# Altium footprint library tinyCamera.PcbLib: 101 footprints (part 5 of 7)
Each footprint in its own frame and in the unit in brackets; x right, y up, seen from the top. Pads: shape width x height; smd on the part's side, far side on the other; paste and mask are expansions set on the pad; w line width, h text height; cw(c..) or ccw(c..) is an arc to the next point about the centre after c.
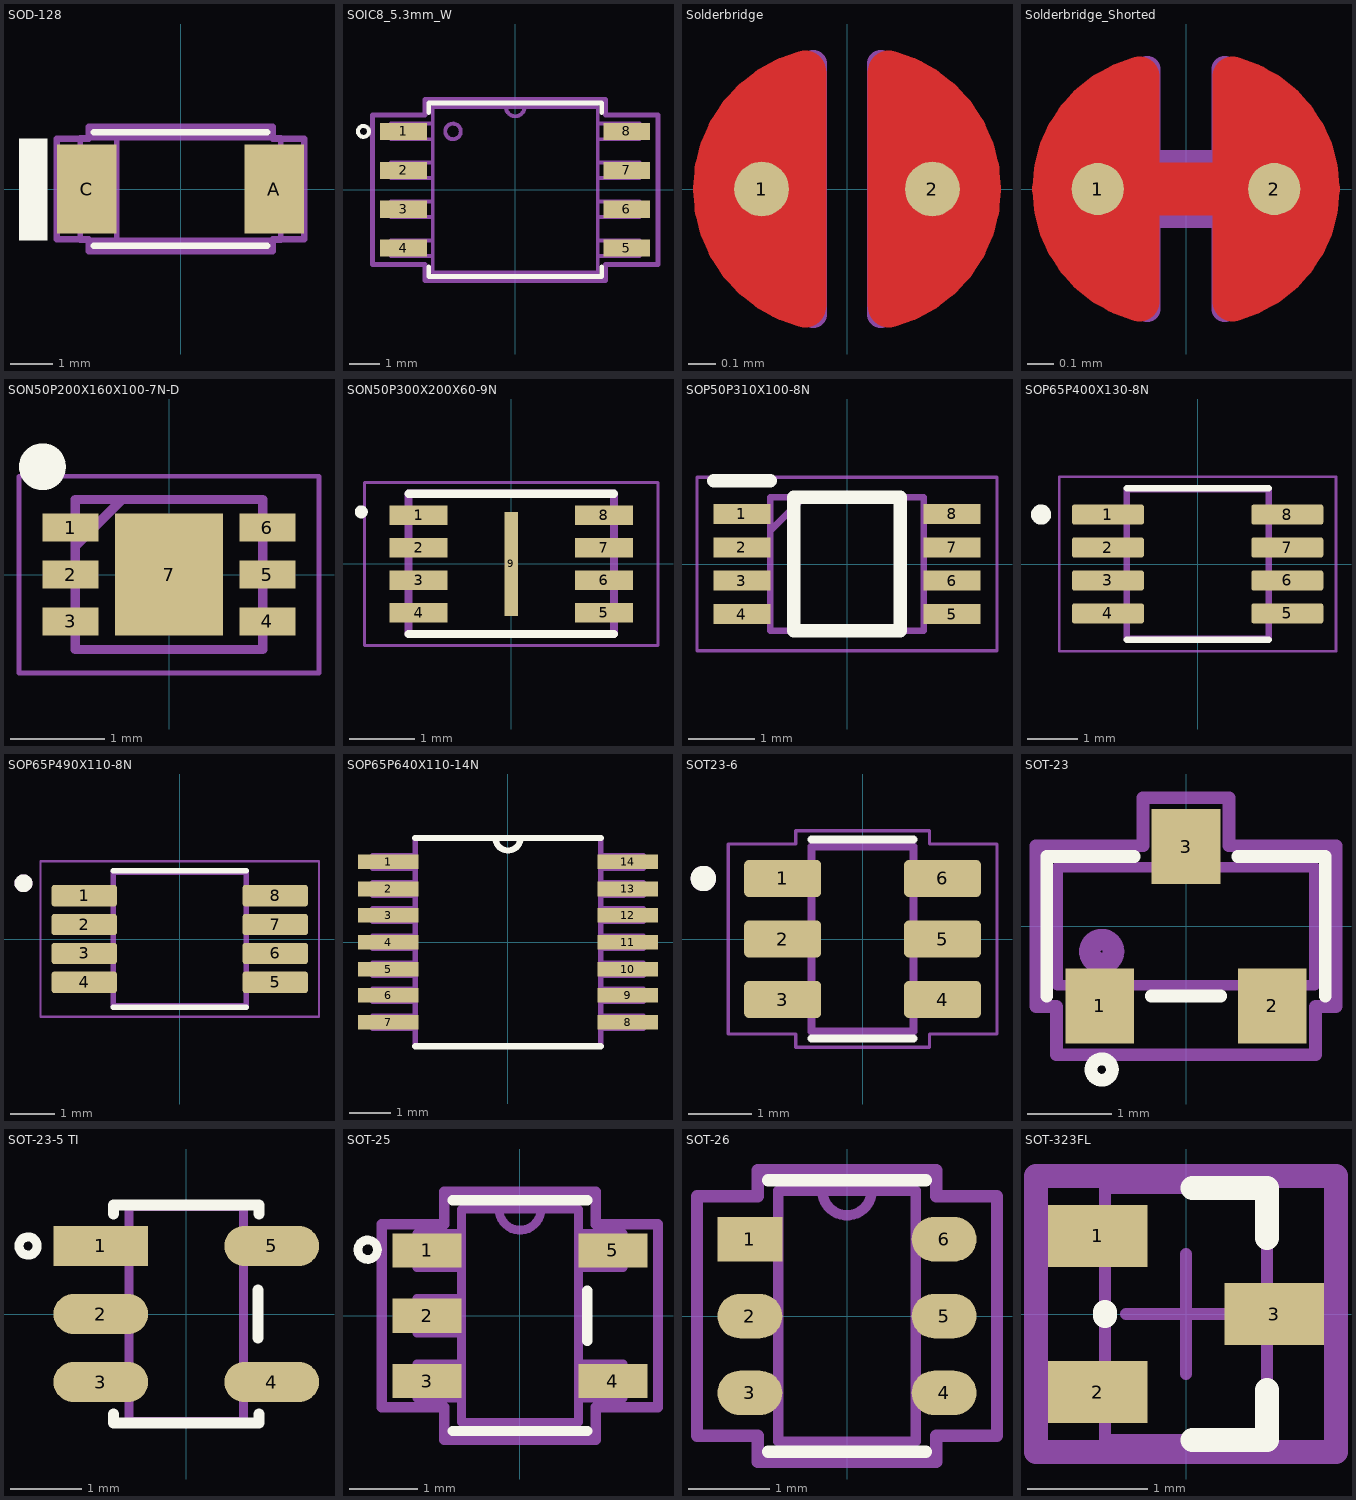
[diagram p4: the footprints below, top view; thin cyan lines are the x and y axes]

## SOD-128 [mm]
pads (2):
  rect 1.4x2.1 smd paste+0 mask+0: A(2.2,0) C(-2.2,0)
Top Overlay:
  rectangle: -3.792,-1.206 -3.124,1.181
  lines w0.152: -2.032,-1.333 2.032,-1.333 ; -2.032,1.333 2.032,1.333
Mechanical 13:
  lines w0.127: -1.5,-1.2 -1.5,1.2 ; -2.35,-1.2 2.35,-1.2 2.35,1.2 -2.35,1.2 -2.35,-1.2
  text ".Designator" at -0.433,-0.376 h1.27
Mechanical 15:
  lines w0.152: -2.908,-1.181 -2.159,-1.181 -2.159,-1.46 2.159,-1.46 2.159,-1.181 2.908,-1.181 2.908,1.181 2.159,1.181 2.159,1.46 -2.159,1.46 -2.159,1.181 -2.908,1.181 -2.908,-1.181
3D body "M-FLAT_TOS.step": height 1.1, standoff 0, extent -2.451,-1.206 2.451,1.206

## SOIC8_5.3mm_W [mil]
pads (8):
  rect 60x22 smd paste+0 mask+0: 1(-143.5,75) 2(-143.5,25) 3(-143.5,-25) 4(-143.5,-75) 5(143.5,-75) 6(143.5,-25) 7(143.5,25) 8(143.5,75)
Top Overlay:
  circle w5: c-195,75 r7.07
  lines w6: -111,-98.86 -111,-111.5 111,-111.5 111,-98.86 ; -111,98.86 -111,111.5 111,111.5 111,98.86
Mechanical 13:
  circle w5: c-80,75 r10
  lines w5: -12,106.5 ccw(c0,106.5) 12,106.5 ; -159.5,-85 -106,-85 -106,-65 -159.5,-65 -159.5,-85 ; -159.5,-35 -106,-35 -106,-15 -159.5,-15 -159.5,-35 ; -159.5,15 -106,15 -106,35 -159.5,35 -159.5,15 ; -159.5,65 -106,65 -106,85 -159.5,85 -159.5,65 ; -106,-106.5 -106,106.5 106,106.5 106,-106.5 -106,-106.5 ; 106,-85 159.5,-85 159.5,-65 106,-65 106,-85 ; 106,-35 159.5,-35 159.5,-15 106,-15 106,-35 ; 106,15 159.5,15 159.5,35 106,35 106,15 ; 106,65 159.5,65 159.5,85 106,85 106,65
  text ".Designator" at -6.12,-16.12 h50
Mechanical 15:
  lines w6: -183.5,-96 -116,-96 -116,-116.5 116,-116.5 116,-96 183.5,-96 183.5,96 116,96 116,116.5 -116,116.5 -116,96 -183.5,96 -183.5,-96
3D body "SOIC8_S2A_SST_MCH.step": height 85.12, standoff 0, extent -159.48,-106.49 159.49,106.5

## Solderbridge [mm]
pads (2):
  round 0.2 smd paste-10: 1(-0.312,0) 2(0.312,0)
Top Layer:
  region: 0.077,0.432 0.152,0.505 0.271,0.467 0.335,0.424 0.409,0.351 0.462,0.292 0.521,0.193 0.549,0.099 0.544,-0.122 0.518,-0.193 0.434,-0.33 0.351,-0.411 0.259,-0.469 0.157,-0.5 0.107,-0.483 0.077,-0.43
  region: -0.077,-0.432 -0.152,-0.505 -0.271,-0.467 -0.335,-0.424 -0.409,-0.351 -0.462,-0.292 -0.521,-0.193 -0.549,-0.099 -0.544,0.122 -0.518,0.193 -0.434,0.33 -0.351,0.411 -0.259,0.469 -0.157,0.5 -0.107,0.483 -0.077,0.43
  lines w0.152: -0.153,-0.431 cw(c-0.042,0) -0.487,0 cw(c-0.042,0) -0.153,0.431 ; 0.153,-0.431 ccw(c0.042,0) 0.153,0.431
Top Solder:
  circle w0.61: c-0.003,0 r0.279
Mechanical 13:
  lines w0.1: -0.123,-0.459 cw(c-0.042,0) -0.123,0.459 -0.123,-0.459 ; 0.123,-0.459 ccw(c0.042,0) 0.123,0.459 0.123,-0.459
  text ".Designator" at 0.635,-0.152 h1.27

## Solderbridge_Shorted [mm]
pads (2):
  round 0.2 smd paste-10: 1(-0.338,0) 2(0.338,0)
Top Layer:
  region: 0.102,0.432 0.178,0.505 0.296,0.467 0.361,0.424 0.434,0.351 0.488,0.292 0.546,0.193 0.574,0.099 0.569,-0.122 0.544,-0.193 0.46,-0.33 0.376,-0.411 0.284,-0.469 0.183,-0.5 0.132,-0.483 0.102,-0.43
  region: -0.102,-0.432 -0.178,-0.505 -0.296,-0.467 -0.361,-0.424 -0.434,-0.351 -0.488,-0.292 -0.546,-0.193 -0.574,-0.099 -0.569,0.122 -0.544,0.193 -0.46,0.33 -0.376,0.411 -0.284,0.469 -0.183,0.5 -0.132,0.483 -0.102,0.43
  lines w0.152: -0.178,-0.431 cw(c-0.068,0) -0.178,0.431 ; 0.178,-0.431 ccw(c0.068,0) 0.178,0.431
  lines w0.203: -0.338,0 0.338,0
Top Solder:
  circle w0.61: c-0.028,0 r0.279
  circle w0.61: c0.028,0 r0.279
Mechanical 13:
  lines w0.1: -0.148,-0.459 cw(c-0.067,0) -0.148,0.459 -0.148,0.1 0.148,0.1 0.148,0.459 cw(c0.067,0) 0.148,-0.459 0.148,-0.1 -0.148,-0.1 -0.148,-0.459
  text ".Designator" at 0.675,-0.387 h1.27

## SON50P200X160X100-7N-D [mm]
pads (7):
  rect 0.6x0.3 smd mask+0.051: 1(-1.05,0.5) 2(-1.05,0) 3(-1.05,-0.5) 4(1.05,-0.5) 5(1.05,0) 6(1.05,0.5)
  rect 1.15x1.3 smd mask+0.051: 7(0,0)
Top Overlay:
  circle w0.25: c-1.35,1.15 r0.125
Mechanical 13:
  lines w0.1: -1,0.3 -0.5,0.8 ; -1,-0.8 1,-0.8 1,0.8 -1,0.8 -1,-0.8
  text ".Designator" at -0.504,-0.363 h1.52
Mechanical 15:
  lines w0.05: -1.6,-1.05 1.6,-1.05 1.6,1.05 -1.6,1.05 -1.6,-1.05
3D body "NCP349MNAETBG.stp": height 1, standoff 0, extent -1.05,-0.8 1.05,0.8

## SON50P300X200X60-9N [mm]
pads (9):
  rect 0.89x0.3 smd mask+0.051: 1(-1.42,0.75) 2(-1.42,0.25) 3(-1.42,-0.25) 4(-1.42,-0.75) 5(1.42,-0.75) 6(1.42,-0.25) 7(1.42,0.25) 8(1.42,0.75)
  rect 0.2x1.6 smd mask+0.051: 9(0,0)
Top Overlay:
  circle w0.1: c-2.3,0.8 r0.05
  lines w0.127: -1.575,-1.075 1.575,-1.075 ; -1.575,1.075 1.575,1.075
Mechanical 13:
  lines w0.127: -1.575,-1.075 -1.575,1.075 1.575,1.075 1.575,-1.075 -1.575,-1.075
  text ".Designator" at -1.708,-0.054 h0.8
Mechanical 15:
  lines w0.05: -2.25,-1.25 2.25,-1.25 2.25,1.25 -2.25,1.25 -2.25,-1.25
3D body: height 0.6, standoff 0, extent -1.563,-1.064 1.563,1.064

## SOP50P310X100-8N [mm]
pads (8):
  rect 0.85x0.3 smd: 1(-1.575,0.75) 2(-1.575,0.25) 3(-1.575,-0.25) 4(-1.575,-0.75) 5(1.575,-0.75) 6(1.575,-0.25) 7(1.575,0.25) 8(1.575,0.75)
Top Overlay:
  lines w0.2: -2,1.25 -1.15,1.25 ; -0.8,-1 -0.8,1 0.8,1 0.8,-1 -0.8,-1
Mechanical 13:
  lines w0.1: -1.15,0.5 -0.65,1 ; -1.15,-1 -1.15,1 1.15,1 1.15,-1 -1.15,-1
Mechanical 15:
  lines w0.05: -2.25,-1.3 -2.25,1.3 2.25,1.3 2.25,-1.3 -2.25,-1.3
3D body "LSF0102DCH.stp": height 0.8, standoff 0, extent -1.559,-0.95 1.554,1.05

## SOP65P400X130-8N [mm]
pads (8):
  rrect25% 1.42x0.4 smd mask+0.051: 1(-1.77,0.975) 2(-1.77,0.325) 3(-1.77,-0.325) 4(-1.77,-0.975) 5(1.77,-0.975) 6(1.77,-0.325) 7(1.77,0.325) 8(1.77,0.975)
Top Overlay:
  circle w0.2: c-3.09,0.975 r0.1
  lines w0.127: -1.4,-1.495 1.4,-1.495 ; -1.4,1.495 1.4,1.495
Mechanical 13:
  lines w0.127: -1.4,-1.475 -1.4,1.475 1.4,1.475 1.4,-1.475 -1.4,-1.475
  text ".Designator" at -0.366,-0.197 h0.8
Mechanical 15:
  lines w0.05: -2.73,-1.725 -2.73,1.725 2.73,1.725 2.73,-1.725 -2.73,-1.725
3D body "PCA9306DCTR--3DModel-STEP-1.STEP": height 1.3, standoff 0, extent -2,-1.475 2,1.475

## SOP65P490X110-8N [mm]
pads (8):
  rrect25% 1.47x0.48 smd mask+0.051: 1(-2.15,0.975) 2(-2.15,0.325) 3(-2.15,-0.325) 4(-2.15,-0.975) 5(2.15,-0.975) 6(2.15,-0.325) 7(2.15,0.325) 8(2.15,0.975)
Top Overlay:
  circle w0.2: c-3.52,1.255 r0.1
  lines w0.127: -1.5,-1.535 1.5,-1.535 ; -1.5,1.535 1.5,1.535
Mechanical 13:
  circle w0.2: c-3.52,1.255 r0.1
  lines w0.127: -1.5,-1.5 1.5,-1.5 1.5,1.5 -1.5,1.5 -1.5,-1.5
  text ".Designator" at -0.421,-0.339 h1.27
Mechanical 15:
  lines w0.05: -3.135,-1.75 3.135,-1.75 3.135,1.75 -3.135,1.75 -3.135,-1.75
3D body "TCA9509DGKR.STEP": height 1.1, standoff 0, extent -2.45,-1.5 2.45,1.5

## SOP65P640X110-14N [mil]
pads (14):
  rect 58x14 smd: 1(-115,77) 2(-115,51) 3(-115,26) 4(-115,0) 5(-115,-26) 6(-115,-51) 7(-115,-77) 8(115,-77) 9(115,-51) 10(115,-26) 11(115,0) 12(115,26) 13(115,51) 14(115,77)
Top Overlay:
  lines w6: -89,-100 89,-100 ; -89,100 -12,100 ; 89,100 12,100 ; -12,100 ccw(c0,100) 12,100 ; -12,100 12,100
Mechanical 13:
  lines w5: -12,100 ccw(c0,100) 12,100 ; -12,100 12,100 ; -12,100 -89,100 -89,-100 89,-100 89,100 12,100 ; -130,-83 -130,-71 -89,-71 -89,-83 -130,-83 ; -130,-57 -130,-45 -89,-45 -89,-57 -130,-57 ; -130,-32 -130,-20 -89,-20 -89,-32 -130,-32 ; -130,-6 -130,6 -89,6 -89,-6 -130,-6 ; -130,20 -130,32 -89,32 -89,20 -130,20 ; -130,45 -130,57 -89,57 -89,45 -130,45 ; -130,71 -130,83 -89,83 -89,71 -130,71 ; 89,-83 89,-71 130,-71 130,-83 89,-83 ; 89,-57 89,-45 130,-45 130,-57 89,-57 ; 89,-32 89,-20 130,-20 130,-32 89,-32 ; 89,-6 89,6 130,6 130,-6 89,-6 ; 89,20 89,32 130,32 130,20 89,20 ; 89,45 89,57 130,57 130,45 89,45 ; 89,71 89,83 130,83 130,71 89,71
  text ".Designator" at -18.31,-14.45 h50
3D body "SOT402-1_NXP.step": height 43.43, standoff 0, extent -130,-100.51 130,100.51

## SOT23-6 [mm]
pads (6):
  rrect25% 1.21x0.58 smd: 1(-1.255,0.95) 2(-1.255,0) 3(-1.255,-0.95) 4(1.255,-0.95) 5(1.255,0) 6(1.255,0.95)
Top Overlay:
  circle w0.2: c-2.5,0.95 r0.1
  lines w0.127: -0.8,-1.56 0.8,-1.56 ; -0.8,1.56 0.8,1.56
Top Courtyard:
  lines w0.05: -2.11,-1.49 -1.05,-1.49 -1.05,-1.7 1.05,-1.7 1.05,-1.49 2.11,-1.49 2.11,1.49 1.05,1.49 1.05,1.7 -1.05,1.7 -1.05,1.49 -2.11,1.49 -2.11,-1.49
Mechanical 13:
  circle w0.2: c-2.5,0.95 r0.1
  lines w0.127: -0.8,-1.45 0.8,-1.45 0.8,1.45 -0.8,1.45 -0.8,-1.45
  text ".Designator" at -0.084,-0.376 h1.27
3D body "step_temp.STEP": height 1.45, standoff 0, extent -1.4,-1.45 1.4,1.45

## SOT-23 [mil]
pads (3):
  rect 32x35 smd paste+0 mask+0: 1(-40.35,-37.2) 2(40.35,-37.2) 3(0,37.2)
Top Overlay:
  circle w6: c-39.37,-66.93 r5
  lines w6: -65.04,-32.56 -65.04,32.56 -24.14,32.56 ; -16.21,-32.56 16.21,-32.56 ; 24.14,32.56 65.04,32.56 65.04,-32.56
Mechanical 13:
  circle w10: c-39.37,-11.81 r5.57
  lines w1: -50.39,-27.56 -30.32,-27.56 ; -10.04,27.56 10.04,27.56 ; 30.32,-27.56 50.39,-27.56
  lines w5: -50.39,-27.56 -50.39,-49.21 -30.32,-49.21 -30.32,-27.56 ; -10.04,27.56 -10.04,49.21 10.04,49.21 10.04,27.56 ; 30.32,-27.56 30.32,-49.21 50.39,-49.21 50.39,-27.56 ; -60.04,-27.56 -60.04,27.56 60.04,27.56 60.04,-27.56 -60.04,-27.56
  text ".Designator" at -11.46,-12.42 h50
Mechanical 15:
  lines w6: -60.39,-60 -60.39,-37.56 -70.04,-37.56 -70.04,37.56 -20.04,37.56 -20,60 ; -60,-60 60,-60 ; -20.04,60 20.04,60 20.04,37.56 70.04,37.56 70.04,-37.56 60.39,-37.56 60.39,-60
3D body "SC-74-3.stp": height 44.88, standoff 1.38, extent -57.09,-51.18 57.08,51.18

## SOT-23-5 TI [mil] "SOT-753"
height 57
pads (5):
  rect 52x22 smd mask+2: 1(-47,37.4)
  oval 52x22 smd mask+2: 2(-47,0) 3(-47,-37.4) 4(47,-37.4) 5(47,37.4)
Top Overlay:
  circle w5: c-87,37.4 r5
  lines w6: -40,-55 -40,-60 39,-60 ; -40,55 -40,60 ; -39,60 40,60 40,55 ; 39.5,-13.3 39.5,13.3 ; 40,-60 40,-55
Mechanical 13:
  lines w5: -31.5,-59.06 -31.5,59.06 31.5,59.06 31.5,-59.06 -31.5,-59.06
  text ".Designator" at -9.51,-14.7 h50
3D body "21-0057F.stp": height 57.09, standoff 0, extent -59.01,-59.01 59.02,59.02

## SOT-25 [mm]
pads (5):
  rect 1.006x0.5 smd paste+0 mask+0: 1(-1.353,0.95) 2(-1.353,0) 3(-1.353,-0.95) 4(1.353,-0.95) 5(1.353,0.95)
Top Overlay:
  circle w0.127: c-2.215,0.961 r0.141
  lines w0.152: -0.977,-1.677 0.977,-1.677 ; -0.977,1.677 0.977,1.677 ; 0.977,-0.367 0.977,0.367
Mechanical 13:
  lines w0.127: -0.305,1.55 ccw(c0,1.55) 0.305,1.55 ; -1.5,-1.2 -1.5,-0.7 -0.85,-0.7 -0.85,-1.2 -1.5,-1.2 ; -1.5,-0.25 -1.5,0.25 -0.85,0.25 -0.85,-0.25 -1.5,-0.25 ; -1.5,0.7 -1.5,1.2 -0.85,1.2 -0.85,0.7 -1.5,0.7 ; -0.85,-1.55 0.85,-1.55 0.85,1.55 -0.85,1.55 -0.85,-1.55 ; 0.85,-1.2 0.85,-0.7 1.5,-0.7 1.5,-1.2 0.85,-1.2 ; 0.85,0.7 0.85,1.2 1.5,1.2 1.5,0.7 0.85,0.7
  text ".Designator" at -0.566,-0.078 h1.27
Mechanical 15:
  lines w0.152: -2.008,-1.331 -1.104,-1.331 -1.104,-1.804 1.104,-1.804 1.104,-1.331 2.008,-1.331 2.008,1.331 1.104,1.331 1.104,1.804 -1.104,1.804 -1.104,1.331 -2.008,1.331 -2.008,-1.331
3D body "SOT25_DIO.step": height 1.45, standoff 0, extent -1.5,-1.55 1.5,1.55

## SOT-26 [mm]
pads (6):
  rect 0.8x0.55 smd paste+0 mask+0: 1(-1.2,0.95)
  oval 0.8x0.55 smd paste+0 mask+0: 2(-1.2,0) 3(-1.2,-0.95) 4(1.2,-0.95) 5(1.2,0) 6(1.2,0.95)
Top Overlay:
  lines w0.152: -0.977,-1.677 0.977,-1.677 ; -0.977,1.677 0.977,1.677
Mechanical 13:
  lines w0.127: -0.305,1.55 ccw(c0,1.55) 0.305,1.55 ; -0.85,-1.55 -0.85,1.55 0.85,1.55 0.85,-1.55 -0.85,-1.55
  text ".Designator" at -0.201,-0.379 h1.27
Mechanical 15:
  lines w0.152: -1.854,-1.479 -1.104,-1.479 -1.104,-1.804 1.104,-1.804 1.104,-1.479 1.854,-1.479 1.854,1.479 1.104,1.479 1.104,1.804 -1.104,1.804 -1.104,1.479 -1.854,1.479 -1.854,-1.479
3D body "SOT26_DIO.step": height 1.3, standoff 0, extent -1.25,-1.55 1.25,1.55

## SOT-323FL [mm]
pads (3):
  rect 0.83x0.52 smd paste+0 mask+0.05: 1(-0.735,0.65) 2(-0.735,-0.65) 3(0.735,0)
Top Overlay:
  lines w0.2: -0.675,-0.015 -0.675,0.015 ; 0.055,-1.05 0.675,-1.05 0.675,-0.635 ; 0.055,1.05 0.675,1.05 0.675,0.635
Mechanical 13:
  lines w0.102: -0.675,-1.05 0.675,-1.05 0.675,1.05 -0.675,1.05 -0.675,-1.05
  text ".Designator" at -0.248,0.517 h0.8
Mechanical 15:
  lines w0.1: -0.5,0 0.5,0 ; 0,-0.5 0,0.5
  lines w0.2: -1.25,-1.15 1.25,-1.15 ; -1.25,-1.15 -1.25,1.15 ; -1.25,-1.15 -1.25,1.15 ; -1.25,-1.15 1.25,-1.15 ; -1.25,1.15 1.25,1.15 ; -1.25,1.15 1.25,1.15 ; 1.25,-1.15 1.25,1.15 ; 1.25,-1.15 1.25,1.15
3D body "Trans_Rohm_RU1J002YNTCL_eec.STEP": height 1.06, standoff 0, extent -1.05,-1 1.05,1